# Altium schematic symbol library SCHLIB.SchLib: 2608 symbols (part 5 of 20) (continued)
## IC-CSD95480RWJT
designator U?, comment CSD95480
70A Synchronous Buck NexFET™ Smart Power Stage 41-PQFN; Manufacturer: Texas Instruments; Manufacturer Part Number: CSD95480RWJT; Interface: PWM; Max Output Current: 90A; Input Voltage (Max): 16; Input Voltage (Min): 4.5; Output Current (Max): 70; Supplier 1: Mouser; Supplier Part Number 1: 595-CSD95480RWJT; RoHS: Yes; Category: Smart Power Stage; Pricing 1: 1=6.86000, 10=6.16000, 25=5.82000, 50=5.82000, 100=5.05000, 250=4.78000, 1000=4.78000, 10000=4.78000 (USD); Mount: Surface Mount; Case/Package: VQFN-41; Number of Pins: 41; Min Operating Temperature: -55°C; Max Operating Temperature: 150°C; Packaging: Tape and Reel; Output Current per Channel: 70A; RoHS Compliant: Yes; ComponentLink1URL: http://www.ti.com/lit/ds/symlink/csd95480rwj.pdf?src-supplier=Digi-Key; ComponentLink1Description: http://www.ti.com/lit/ds/symlink/csd95480rwj.pdf?src-supplier=Digi-Key
footprint PowerTFQFN-41
pins: 1 VOS (in) "Output voltage sensing pin for the internal current sensing circuitry.", 2 AGND (power) "This pin is internally connected to PGND.", 3 VDD (power) "Supply Voltage for internal circuitry.", 4 PVDD (power) "Supply Voltage for Gate Drivers.", 5 PGND (power) "Power Ground.", 6 NC "Not Connected. This pin needs to be left floating in application.", 7 PGND (power) "Power Ground", 8 PGND (power) "Power Ground", 9 PGND (power) "Power Ground", 10 VSW (power) "Phase node connecting the HS MOSFET Source and LS MOSFET Drain – pin connection to the output inductor.", 11 VSW (power) "Phase node connecting the HS MOSFET Source and LS MOSFET Drain – pin connection to the output inductor.", 12 VSW (power) "Phase node connecting the HS MOSFET Source and LS MOSFET Drain – pin connection to the output inductor.", 13 VSW (power) "Phase node connecting the HS MOSFET Source and LS MOSFET Drain – pin connection to the output inductor.", 14 VSW (power) "Phase node connecting the HS MOSFET Source and LS MOSFET Drain – pin connection to the output inductor.", 15 VSW (power) "Phase node connecting the HS MOSFET Source and LS MOSFET Drain – pin connection to the output inductor.", 16 VSW (power) "Phase node connecting the HS MOSFET Source and LS MOSFET Drain – pin connection to the output inductor.", 17 VSW (power) "Phase node connecting the HS MOSFET Source and LS MOSFET Drain – pin connection to the output inductor.", 18 VSW (power) "Phase node connecting the HS MOSFET Source and LS MOSFET Drain – pin connection to the output inductor.", 19 VSW (power) "Phase node connecting the HS MOSFET Source and LS MOSFET Drain – pin connection to the output inductor.", 20 PGND (power) "Power Ground", 21 PGND (power) "Power Ground", 22 PGND (power) "Power Ground", 23 PGND (power) "Power Ground", 24 PGND (power) "Power Ground", 25 VIN (power) "Input Voltage Pin. Connect input capacitors close to this pin", 26 VIN (power) "Input Voltage Pin. Connect input capacitors close to this pin", 27 VIN (power) "Input Voltage Pin. Connect input capacitors close to this pin", 28 VIN (power) "Input Voltage Pin. Connect input capacitors close to this pin", 29 VIN (power) "Input Voltage Pin. Connect input capacitors close to this pin", 30 VIN (power) "Input Voltage Pin. Connect input capacitors close to this pin", 31 NC "Input Voltage Pin. Connect input capacitors close to this pin", 32 BOOTR "Return path for HS gate driver. It is connected to VSW internally.", 33 BOOT "Bootstrap capacitor connection. Connect a minimum 0.1uF 16V X5R, ceramic cap from BOOT to BOOT_R pins. The bootstrap capacitor provides the charge to turn on the Control FET. The bootstrap diode is integrated", 34 PWM (in) "Three state input from external controller. Logic Low sets Control FET gate low and Sync FET gate high. Logic High sets Control FET gate high and Sync FET gate Low. Both MOSFET gates are set low if PWM stays in Hi-Z for greater than the Three State Shutd", 35 EN/FCCM (in) "This dual function pin either enables the Diode Emulation function or is used to quickly disable the LS for controller-side diode emulation. When this pin is held at 1.7V, Diode Emulation Mode is enabled for Sync FET. When the pin is High, device operate", 36 TAO/FAULT (out) "Temperature Amplifier Output. Reports a voltage proportional to the IC temperature. An oring diode is integrated in the IC. When used in multiphase application, a single wire can be used to connect the TAO pins of all the ICs. Only the highest temperatur", 37 LSET (in) "A Resistor from this pin to PGND pin sets the inductor value for the internal current sensing circuitry", 38 IOUT (in) "Output of Current Sensing Amplifier. V(IOUT) – V(REFIN) is proportional to the phase current", 39 REFIN (in) "External reference voltage input for Current Sensing Amplifier.", 40 PGND (power) "Power Ground.", 41 NC "Not Connected. This pin needs to be left floating in application"

## IC-CSR1010A05-IQQM-R
designator U?, comment CSR1010A05-IQQM-R  Package: QFN-32
IC RF TXRX+MCU BLUETOOTH 32UFQFN; Manufacturer: Qualcomm; Washability: OK; Supplier 1: Digi-Key; Manufacturer Part Number: CSR1010A05-IQQM-R; Stock 1: 14468; Pricing 1: 1=2.57, 10=2.323, 25=2.0736, 100=1.8664, 250=1.659, 500=1.45162, 1000=1.20278 (USD); Supplier Part Number 1: CSR1010A05-IQQM-RDKR-ND
footprint QFN-32
pins: 0 GND, 1 VDD_BAT, 2 XTAL_32K_OUT, 3 XTAL_32K_IN, 4 WAKE, 5 VDD_CORE, 6 VDD_REG_IN, 7 RF, 8 VDD_XTAL, 9 XTAL_16M_OUT, 10 XTAL_16M_IN, 11 AIO[2], 12 AIO[1], 13 AIO[0], 14 PIO[1] /UART_TX, 15 PIO[1] /UART_RX, 16 PIO[3] /SF_DIN, 17 PIO[4] /SF_CS#, 18 PIO[5] /DEBUG_CLK, 19 PIO[6] /DEBUG_CS#, 20 PIO[7] /DEBUG_MOSI, 21 VDD_PADS, 22 PIO[8] /DEBUG_MISO, 23 PIO[9], 24 PIO[10], 25 PIO[11], 26 SPI_PIO#, 27 PIO[2], 28 I2C_SCL, 29 I2C_SDA, 30 VDD_CORE, 31 SMPS_LX, 32 VDD_BAT_SMPS

## IC-DAC5311IDCKR
designator U?, comment DAC5311
IC DAC 8BIT 1CH LP SC70-6; Manufacturer: Texas Instruments; Manufacturer Part Number: DAC5311IDCKR; Number of Channels: 1; Max Supply Voltage: 5.5V; Min Supply Voltage: 2V; Max Power Dissipation: 880uW; Interface: SPI; Settling Time: 6us; Number of Bits: 8; Resolution: 8b; Sampling Rate: 225KS/s; Supply Type: Single; Integral Nonlinearity (INL): 0.25LSB; Spurious-free dynamic range (SFDR): 65dB; Signal to Noise Ratio (SNR): 81dB; Nominal Supply Current: 110uA; Polarity: Unipolar; Output Type: Voltage; Washability: OK; Supplier 1: Digi-Key; Supplier Part Number 1: 296-24180-6-ND; Stock 1: 19970; Pricing 1: 1=1.5, 10=1.337, 100=1.0424, 500=0.86108, 1000=0.6798 (USD); Case/Package: SC; Number of Pins: 6; Contact Plating: Gold; Min Operating Temperature: -40°C; Max Operating Temperature: 125°C; Packaging: Tape and Reel; Package Quantity: 3000; Number of DAC Channels: 1; Number of Converters: 1; Conversion Rate: 225KS/s; Differential Nonlinearity: 0.25LSB; Radiation Hardening: No; REACH SVHC: No SVHC; Lead Free: Lead Free; ComponentLink1URL: http://www.farnell.com/datasheets/1725053.pdf?src-supplier=Element14; ComponentLink1Description: http://www.farnell.com/datasheets/1725053.pdf?src-supplier=Element14; ComponentLink2URL: http://www.ti.com/lit/ds/symlink/dac5311.pdf?src-supplier=Digi-Key; ComponentLink2Description: http://www.ti.com/lit/ds/symlink/dac5311.pdf?src-supplier=Digi-Key; ComponentLink3URL: http://www.produktinfo.conrad.com/datenblaetter/1100000-1199999/001186518-da-01-en-IC_DAC_8BIT_1CH_DAC5311IDCKR_SC_70_6_TID.pdf?src-supplier=Conrad; ComponentLink3Description: http://www.produktinfo.conrad.com/datenblaetter/1100000-1199999/001186518-da-01-en-IC_DAC_8BIT_1CH_DAC5311IDCKR_SC_70_6_TID.pdf?src-supplier=Conrad
footprint SOT-363
pins: 1 ~{SYNC}, 2 SCLK, 3 DIN, 4 AVDD, 5 GND, 6 VOUT

## IC-DMG6968UDM-7
designator U?, comment DMG6968
MOSFET 2N-CH 20V 6.5A SOT-26; Manufacturer: Diodes; Manufacturer Part Number: DMG6968UDM-7; Number of Channels: 2; Element Configuration: Dual; Gate to Source Voltage (Vgs): 8V; On-State Resistance: 24mR; Power Dissipation: 850mW; Turn-Off Delay Time: 562ns; Turn-On Delay Time: 53ns; Fall Time: 234ns; Input Capacitance: 143pF; Rise Time: 78ns; FET Type: 2 N-Channel; Washability: OK; RoHS: Yes; Category: MOSFETs; Mount: Surface Mount; Case/Package: SOT-26; Number of Pins: a; Min Operating Temperature: -55°C; Max Operating Temperature: 150°C; Drain to Source Voltage (Vdss): 20V; Continuous Drain Current (ID): 6.5A; Drain to Source Breakdown Voltage: 20V; Drain to Source Resistance: 24mR; Package Quantity: 3000; Packaging: Tape and Reel; Rds On Max: 24mR; Max Power Dissipation: 850mW; Number of Elements: 2; Length: 3mm; Height: 1.1mm; Width: 1.6mm; Radiation Hardening: No; REACH SVHC: No SVHC; Lead Free: Lead Free; ComponentLink1URL: https://datasheet.ciiva.com/929/ds31758-929568.pdf?src-supplier=Digi-Key; ComponentLink1Description: https://datasheet.ciiva.com/929/ds31758-929568.pdf?src-supplier=Digi-Key; ComponentLink2URL: https://datasheet.ciiva.com/11174/ds31758-11174898.pdf?src-supplier=Avnet; ComponentLink2Description: https://datasheet.ciiva.com/11174/ds31758-11174898.pdf?src-supplier=Avnet; ComponentLink3URL: https://datasheet.ciiva.com/4443/ds31758-90272-4443012.pdf?src-supplier=Mouser; ComponentLink3Description: https://datasheet.ciiva.com/4443/ds31758-90272-4443012.pdf?src-supplier=Mouser; ComponentLink4URL: https://datasheet.ciiva.com/929/ds31758-929569.pdf?src-supplier=Digi-Key; ComponentLink4Description: https://datasheet.ciiva.com/929/ds31758-929569.pdf?src-supplier=Digi-Key; Supplier 1: Digi-Key; Supplier Part Number 1: DMG6968UDMDICT-ND; Stock: 55957; Pricing: 1=0.44, 10=0.379, 25=0.3536, 100=0.2626, 250=0.2495, 500=0.205, 1000=0.1667 (USD)
footprint SOT23-6
pins: 1 S1, 2 D1/D2, 3 S2 , 4 G2, 5 D1/D2, 6 G1

## IC-DS90UB953TRHBRQ1
designator U?, comment DS90UB953TRHBRQ1
2MP MIPI CSI-2 FPD-Link III Serializer; Manufacturer: Texas Instruments; Data Rate: 4.16Gbps; Number of Inputs: 1; Supplier 1: Digi-Key; Manufacturer Part Number: DS90UB953TRHBRQ1; RoHS: Yes; Category: Interface ICs; Pricing 1: 1=11.13000, 10=10.22900, 25=9.80480, 100=8.75000 (USD); Mount: Surface Mount; Case/Package: VQFN; Min Operating Temperature: -40°C; Max Operating Temperature: 105°C; Packaging: Tape and Reel; Number of Outputs: 1; RoHS Compliant: Yes; ComponentLink1URL: http://www.ti.com/lit/ds/symlink/ds90ub953-q1.pdf?src-supplier=Digi-Key; ComponentLink1Description: http://www.ti.com/lit/ds/symlink/ds90ub953-q1.pdf?src-supplier=Digi-Key; Supplier Part Number 1: 296-49634-1-ND
part A pins: 1 CSI_D1P (in), 2 CSI_D1N (in), 3 CSI_D0P (in), 4 CSI_D0N (in), 5 CSI_CLKP (in), 6 CSI_CLKN (in), 7 RES0 (in), 8 PDB (in), 9 LPF1, 12 LPF2, 13 DOUT- (io), 14 DOUT+ (io), 17 GPIO_0 (io), 18 GPIO_1 (io), 19 CLK_OUT/IDX (io), 20 CLKIN (in), 21 MODE (in), 22 RES1, 23 I2C_SDA (io), 24 I2C_SCL (io), 27 GPIO_2 (io), 28 GPIO_3 (io), 29 CSI_D3P (in), 30 CSI_D3N (in), 31 CSI_D2P (in), 32 CSI_D2N (in), 33 GND (power)
part B pins: 10 VDDPLL_CAP (power), 11 VDDPLL (power), 15 VDDDRV_CAP (power), 16 VDDDRV (power), 25 VDDD (power), 26 VDDD_CAP (power)

## IC-DS1683S+T&R
designator U?, comment DS1683S
IC REAL TIME EVENT REC 8SOIC; Manufacturer: Maxim; Manufacturer Part Number: DS1683S+T&R; Interface: I2C,Serial,2-Wire; Time Format: Binary; Memory Size: 16B; Logic Function: Clock; Supplier 1: Digi-Key; Supplier Part Number 1: DS1683S+T&RCT-ND; Stock: 3510; Pricing: 1=4.38, 10=3.932, 25=3.7172, 100=3.2217, 250=3.0565, 500=2.7426, 1000=2.313 (USD); RoHS: Yes; Mount: Surface Mount; Case/Package: SOIC; Number of Pins: 8; Min Operating Temperature: -40°C; Max Operating Temperature: 85°C; Package Quantity: 2500; Packaging: Tape and Reel; Date Format: Binary; ComponentLink1URL: https://datasheet.ciiva.com/14244/ds1683-14244282.pdf?src-supplier=Avnet; ComponentLink1Description: https://datasheet.ciiva.com/14244/ds1683-14244282.pdf?src-supplier=Avnet
footprint SOIC8
pins: 1 EVENT, 2 NC, 3 ALARM, 4 GND, 5 SCL, 6 SDA, 7 NC, 8 VCC

## IC-EL3H7(B)(TA)-VG
designator U?, comment EL3H7(B)(TA)-VG
OPTOISOLATOR 3.75KV TRANS 4-SSOP; Manufacturer: Everlight; Max Output Voltage: 80V; Output Current per Channel: 50mA; Collector Emitter Saturation Voltage: 200mV; Fall Time: 18000ns; Number of Elements: 1; Power Dissipation: 200mW; Current Transfer Ratio: 260%; Forward Voltage: 1.4V; Reverse Breakdown Voltage: 6V; Approvals: UL; Supplier 1: Digi-Key; Supplier Part Number 1: 1080-1197-1-ND; Manufacturer Part Number: EL3H7(B)(TA)-VG; Stock: 190343; Pricing: 1=0.47, 10=0.333, 100=0.1957, 500=0.1354, 1000=0.1128, 2000=0.1015 (USD); RoHS: Yes; Mount: Surface Mount; Case/Package: SSOP; Number of Pins: 4; Min Operating Temperature: -55°C; Max Operating Temperature: 125°C; Max Input Current: 50mA; Max Collector Current: 50mA; Isolation Voltage: 3.75kV; Collector Emitter Breakdown Voltage: 80V; Packaging: Tape and Reel; Package Quantity: 1; Number of Channels: 1; Collector Emitter Voltage (VCEO): 80V; Max Power Dissipation: 200mW; Forward Current: 50mA; Rise Time: 18000ns; Radiation Hardening: No; Lead Free: Lead Free; ComponentLink1URL: https://datasheet.ciiva.com/2086/el3h7-g-series-2086501.pdf?src-supplier=Digi-Key; ComponentLink1Description: https://datasheet.ciiva.com/2086/el3h7-g-series-2086501.pdf?src-supplier=Digi-Key; ComponentLink2URL: https://datasheet.ciiva.com/2086/el3h7-g-series-2086502.pdf?src-supplier=Digi-Key; ComponentLink2Description: https://datasheet.ciiva.com/2086/el3h7-g-series-2086502.pdf?src-supplier=Digi-Key; ComponentLink3URL: https://datasheet.ciiva.com/2086/el3h7-g-series-2086503.pdf?src-supplier=Digi-Key; ComponentLink3Description: https://datasheet.ciiva.com/2086/el3h7-g-series-2086503.pdf?src-supplier=Digi-Key; ComponentLink4URL: https://datasheet.ciiva.com/15209/getdatasheetpartid-416716-15209115.pdf?src-supplier=Verical; ComponentLink4Description: https://datasheet.ciiva.com/15209/getdatasheetpartid-416716-15209115.pdf?src-supplier=Verical
footprint SOIC4
pins: 1, 2, 3, 4

## IC-HEF4011BT,653
designator U?, comment HEF4011BT  Case/Package: SOIC14
IC GATE NAND 4CH 2-INP SOIC14; Manufacturer: NXP Semiconductors; Manufacturer Part Number: HEF4011BT,653; Output Current: 2.4mA; Max Supply Voltage: 15V; Min Supply Voltage: 3V; Quiescent Current: 1uA; Propagation Delay: 110ns; Number of Outputs: 1; Number of Inputs: 2; Number of Circuits: 4; High Level Output Current: -4.2mA; Low Level Output Current: 4.2mA; Turn-On Delay Time: 20ns; Washability: OK; Supplier 1: Digi-Key; Stock 1: 0; Mount: Surface Mount; Number of Pins: 14; Contact Plating: Gold; Min Operating Temperature: -40°C; Max Operating Temperature: 125°C; Packaging: Tape and Reel; Logic Function: NAND; Package Quantity: 1; Number of Gates: 4; Number of Input Lines: 2; Number of Output Lines: 1; Number of Elements: 4; Voltage: 15V; Radiation Hardening: No; REACH SVHC: No SVHC; Lead Free: Lead Free; ComponentLink1URL: http://www.nxp.com/documents/data_sheet/HEF4011B.pdf; ComponentLink1Description: http://www.nxp.com/documents/data_sheet/HEF4011B.pdf; ComponentLink2URL: https://www.verical.com/server-webapp/html/getDatasheet?partID=246727; ComponentLink2Description: https://www.verical.com/server-webapp/html/getDatasheet?partID=246727; ComponentLink3URL: http://www.farnell.com/datasheets/2051437.pdf; ComponentLink3Description: http://www.farnell.com/datasheets/2051437.pdf; Supplier Part Number 1: 568-8223-1-ND
footprint SOIC14
pins: 1 1A, 2 1B, 3 1Y, 4 2Y, 5 2A, 6 2B, 7 GND, 8 3A, 9 3B, 10 3Y, 11 4Y, 12 4A, 13 4B, 14 VCC

## IC-HEF4051BT,653
designator U?, comment HEF4051BT
IC MUX/DEMUX 8X1 16SOIC; Manufacturer: Nexperia USA; Manufacturer Part Number: HEF4051BT,653; Washability: OK; Supplier 1: Digi-Key; Stock 1: 5426; Pricing 1: 1=0,45000, 10=0,38500, 25=0,35960, 100=0,28760, 250=0,26704, 500=0,22596, 1000=0,17461 (USD); RoHS: No; ComponentLink1URL: https://assets.nexperia.com/documents/data-sheet/HEF4051B.pdf?src-supplier=Digi-Key; ComponentLink1Description: https://assets.nexperia.com/documents/data-sheet/HEF4051B.pdf?src-supplier=Digi-Key; Supplier Part Number 1: 1727-2947-1-ND
footprint SOIC16
pins: 1 Y4, 2 Y6, 3 Z, 4 Y7, 5 Y5, 6 ~{E}, 7 VEE, 8 VSS, 9 S3, 10 S2, 11 S1, 12 Y3, 13 Y0, 14 Y1, 15 Y2, 16 VDD

## IC-HT0440LG-G
designator IC?, comment HT0440LG-G
IC GATE DRVR HIGH-SIDE 8SOIC; Manufacturer: Microchip Supertex; Output Voltage: 10V; Min Supply Voltage: -500mV; Max Supply Voltage: 7V; Rise Time: 650000ns; Frequency: 2MHz; Nominal Supply Current: 2mA; Number of Outputs: 2; Fall Time: 3000000ns; Turn-On Delay Time: 50us; Turn-Off Delay Time: 150us; Supplier 1: Avnet; Manufacturer Part Number: HT0440LG-G; Stock 1: 3300; Pricing 1: 3300=1.45140, 6600=1.43960, 13200=1.42780, 19800=1.41600, 26400=1.40420 (USD); RoHS: Yes; Mount: Surface Mount; Case/Package: SOIC; Number of Pins: 8; Min Operating Temperature: -40°C; Max Operating Temperature: 85°C; Packaging: Tape and Reel; Package Quantity: 2500; Number of Drivers: 2; ComponentLink1URL: https://datasheet.ciiva.com/15747/ht0440-15747219.pdf?src-supplier=Onlinecomponents.com; ComponentLink1Description: https://datasheet.ciiva.com/15747/ht0440-15747219.pdf?src-supplier=Onlinecomponents.com; ComponentLink2URL: https://datasheet.ciiva.com/30089/729ht0440-30089404.pdf?src-supplier=Onlinecomponents.com; ComponentLink2Description: https://datasheet.ciiva.com/30089/729ht0440-30089404.pdf?src-supplier=Onlinecomponents.com; Supplier Part Number 1: HT0440LG-G
footprint SOIC8-D0008A_M (SOIC, 8-Leads, Body 5x4mm, Pitch 1.27mm, IPC Low Density)
pins: 1 A, 2 CLK, 3 -VOUTA, 4 +VOUTA, 5 +VOUTB, 6 -VOUTB, 7 GND, 8 B

## IC-INA240A3PWR
designator U?, comment INA240A3PWR
IC AMP CURRENT SENSE 8-TSSOP; Manufacturer: Texas Instruments; Number of Circuits: 1; Slew Rate: 2V/µs; -3db Bandwidth: 400kHz; Input Bias Current: 90uA; Input Offset Voltage (Vos): 5uV; Operating Supply Current: 1.8mA; Number of Poles: 2; Fail Short: No; Approvals: UL; Supplier 1: Digi-Key; Supplier Part Number 1: 296-45090-1-ND; Manufacturer Part Number: INA240A3PWR; Stock: 8804; Pricing: 1=2.78, 10=2.499, 25=2.3624, 100=1.9425, 250=1.743, 500=1.68, 1000=1.3965 (USD); RoHS: No; Mount: Surface Mount; Case/Package: TSSOP; Number of Pins: 8; Min Operating Temperature: -40°C; Max Operating Temperature: 125°C; Packaging: Tape and Reel; ComponentLink1URL: http://www.ti.com/general/docs/lit/getliterature.tsp?genericPartNumber=INA240&fileType=pdf&src-supplier=Farnell; ComponentLink1Description: http://www.ti.com/general/docs/lit/getliterature.tsp?genericPartNumber=INA240&fileType=pdf&src-supplier=Farnell; ComponentLink2URL: http://www.ti.com/lit/ds/symlink/ina240.pdf?src-supplier=Digi-Key; ComponentLink2Description: http://www.ti.com/lit/ds/symlink/ina240.pdf?src-supplier=Digi-Key; Weight: 12.345887oz; Contact Plating: Tin; Number of Terminals: 2; Termination: SMD/SMT; Package Quantity: 1500; Length: 5mm; Depth: 5mm; REACH SVHC: No SVHC; ComponentLink3URL: https://datasheet.ciiva.com/4498/2031-xxt-72636-4498914.pdf?src-supplier=Mouser; ComponentLink3Description: https://datasheet.ciiva.com/4498/2031-xxt-72636-4498914.pdf?src-supplier=Mouser; ComponentLink4URL: https://datasheet.ciiva.com/30051/2902031-xxt-30051287.pdf?src-supplier=Onlinecomponents.com; ComponentLink4Description: https://datasheet.ciiva.com/30051/2902031-xxt-30051287.pdf?src-supplier=Onlinecomponents.com; ComponentLink5URL: https://datasheet.ciiva.com/323/2031-xxt-323225.pdf?src-supplier=Digi-Key; ComponentLink5Description: https://datasheet.ciiva.com/323/2031-xxt-323225.pdf?src-supplier=Digi-Key; ComponentLink6URL: https://datasheet.ciiva.com/323/2031-xxt-323226.pdf?src-supplier=Digi-Key; ComponentLink6Description: https://datasheet.ciiva.com/323/2031-xxt-323226.pdf?src-supplier=Digi-Key; ComponentLink7URL: https://datasheet.ciiva.com/323/2031-xxt-323227.pdf?src-supplier=Digi-Key; ComponentLink7Description: https://datasheet.ciiva.com/323/2031-xxt-323227.pdf?src-supplier=Digi-Key
footprint 8-TSSOP
pins: 1 NC, 2 IN+ (hiz), 3 IN- (hiz), 4 GND (power), 5 VS (power), 6 REF2, 7 REF1, 8 OUT (out)
text: -; +

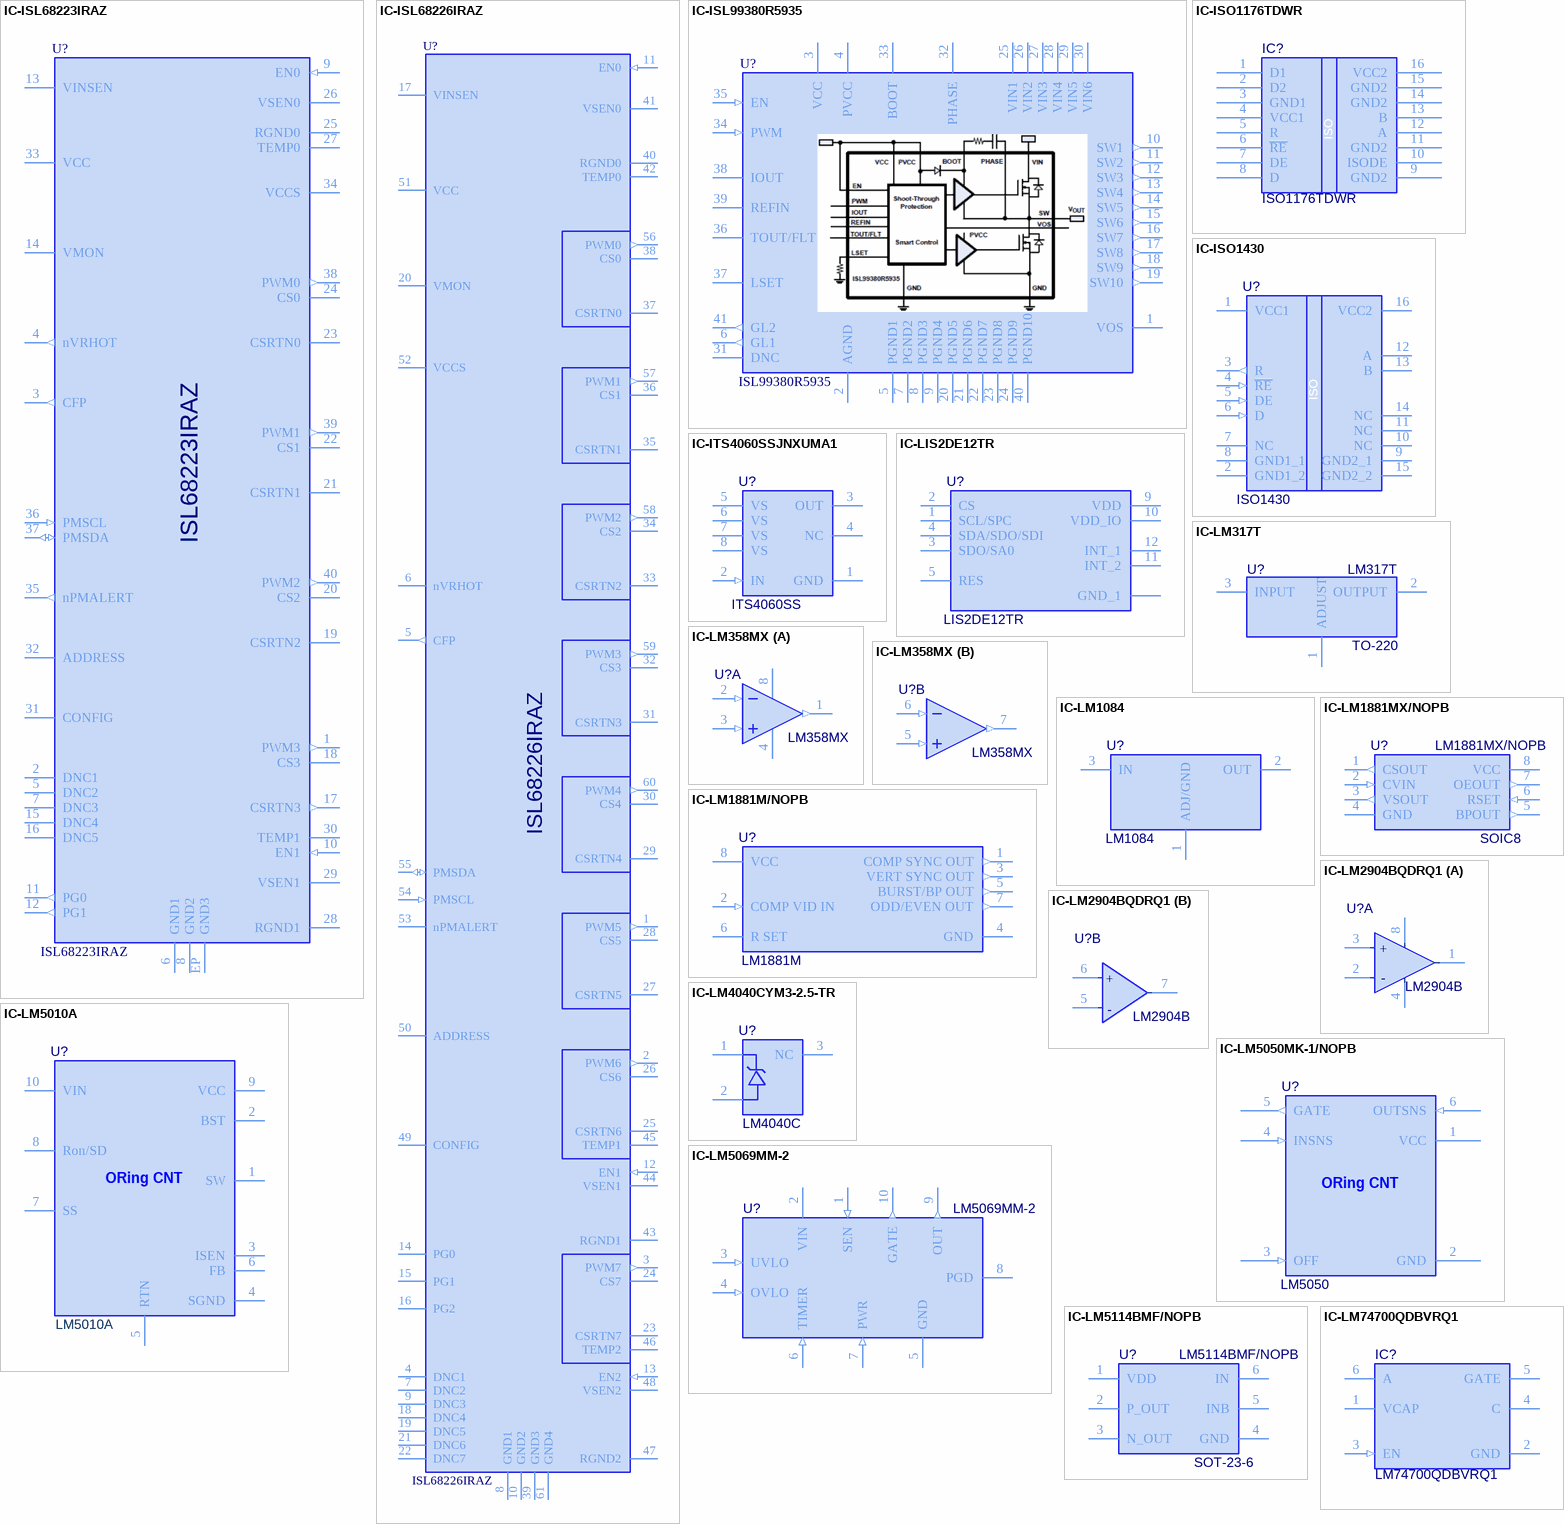
[diagram p19: symbols IC-ISL68223IRAZ to IC-LM74700QDBVRQ1]

## IC-ISL68223IRAZ
designator U?, comment ISL68223IRAZ
Digital Dual Output, 4-Phase PWM Controller; Manufacturer: Renesas; Manufacturer Part Number: ISL68223IRAZ-T; Outputs (Max): 2; Phases (Max): 4; Input Voltage (Min): 4.5; Input Voltage (Max): 18; Output Voltage (Max): 3.05; Output Current (Max): 360; Supplier 1: Mouser; RoHS: No; Category: Multiphase Switching Controller; Pricing 1: 1=6.51000, 10=5.88000, 50=5.61000, 100=4.87000, 1000=4.00000, 10000=4.00000 (USD); Supplier Part Number 1: 968-ISL68223IRAZ-T
pins: 1 PWM3 (out), 2 DNC1, 3 CFP (out), 4 nVRHOT (out), 5 DNC2, 6 GND1 (power), 7 DNC3, 8 GND2 (power), 9 EN0 (in), 10 EN1 (in), 11 PG0 (out), 12 PG1 (out), 13 VINSEN, 14 VMON, 15 DNC4, 16 DNC5, 17 CSRTN3 (out), 18 CS3, 19 CSRTN2 (hiz), 20 CS2, 21 CSRTN1, 22 CS1, 23 CSRTN0, 24 CS0, 25 RGND0, 26 VSEN0, 27 TEMP0, 28 RGND1, 29 VSEN1, 30 TEMP1, 31 CONFIG, 32 ADDRESS, 33 VCC (power), 34 VCCS (power), 35 nPMALERT (out), 36 PMSCL (in), 37 PMSDA (io), 38 PWM0 (out), 39 PWM1 (out), 40 PWM2 (out), EP GND3 (power)

## IC-ISL68226IRAZ
designator U?, comment ISL68226IRAZ
Digital Triple Output, 8-Phase PWM Controller; Manufacturer: Renesas; Outputs (Max): 3; Phases (Max): 8; Input Voltage (Min): 4.5; Input Voltage (Max): 18; Output Voltage (Max): 3.05; Output Current (Max): 720; Supplier 1: Mouser; Manufacturer Part Number: ISL68226IRAZ; RoHS: Yes; Category: Multiphase Switching Controller; Pricing 1: 1=9.03000, 10=8.16000, 50=7.78000, 100=6.75000, 1000=6.45000, 10000=6.45000 (USD); Supplier Part Number 1: 968-ISL68226IRAZ
pins: 1 PWM5 (out), 2 PWM6 (out), 3 PWM7 (out), 4 DNC1, 5 CFP (out), 6 nVRHOT (oc), 7 DNC2, 8 GND1 (power), 9 DNC3, 10 GND2 (power), 11 EN0 (in), 12 EN1 (in), 13 EN2 (in), 14 PG0 (oc), 15 PG1 (oc), 16 PG2 (oc), 17 VINSEN, 18 DNC4, 19 DNC5, 20 VMON, 21 DNC6, 22 DNC7, 23 CSRTN7, 24 CS7, 25 CSRTN6, 26 CS6, 27 CSRTN5, 28 CS5, 29 CSRTN4, 30 CS4, 31 CSRTN3, 32 CS3, 33 CSRTN2, 34 CS2, 35 CSRTN1, 36 CS1, 37 CSRTN0, 38 CS0, 39 GND3 (power), 40 RGND0, 41 VSEN0, 42 TEMP0, 43 RGND1, 44 VSEN1, 45 TEMP1, 46 TEMP2, 47 RGND2, 48 VSEN2, 49 CONFIG, 50 ADDRESS, 51 VCC (power), 52 VCCS (power), 53 nPMALERT, 54 PMSCL (in), 55 PMSDA (io), 56 PWM0 (out), 57 PWM1 (out), 58 PWM2 (out), 59 PWM3 (out), 60 PWM4 (out), 61 GND4 (power)

## IC-ISL99380R5935
designator U?, comment ISL99380R5935
80A Smart Power Stage (SPS) Module with Integrated High Accuracy Current and Temperature Monitors; Manufacturer: Renesas; Manufacturer Part Number: ISL99380FRZ-TR5935; Output Current (Max): 80; Input Voltage (Min): 3; Input Voltage (Max): 16; Switching Frequency (KHz): 1.25; Supplier 1: Mouser; Stock 1: 136; Pricing 1: 1=9.31000, 10=8.41000, 50=8.02000, 100=6.97000, 1000=5.80000, 10000=5.79000 (USD); ComponentLink1URL: https://datasheet.octopart.com/ISL99380FRZ-TR5935-Renesas-datasheet-149167368.pdf?src-supplier=Renesas; ComponentLink1Description: https://datasheet.octopart.com/ISL99380FRZ-TR5935-Renesas-datasheet-149167368.pdf?src-supplier=Renesas; Supplier Part Number 1: 968-SL99380FRZTR5935; Category: Smart Power Stage
pins: 1 VOS (power), 2 AGND (power), 3 VCC (power), 4 PVCC (power), 5 PGND1 (power), 6 GL1 (out), 7 PGND2 (power), 8 PGND3 (power), 9 PGND4 (power), 10 SW1 (out), 11 SW2 (out), 12 SW3 (out), 13 SW4 (out), 14 SW5 (out), 15 SW6 (out), 16 SW7 (out), 17 SW8 (out), 18 SW9 (out), 19 SW10 (out), 20 PGND5 (power), 21 PGND6 (power), 22 PGND7 (power), 23 PGND8 (power), 24 PGND9 (power), 25 VIN1 (power), 26 VIN2 (power), 27 VIN3 (power), 28 VIN4 (power), 29 VIN5 (power), 30 VIN6 (power), 31 DNC, 32 PHASE, 33 BOOT, 34 PWM (in), 35 EN (in), 36 TOUT/FLT (oc), 37 LSET, 38 IOUT, 39 REFIN, 40 PGND10 (power), 41 GL2 (out)

## IC-ISO1176TDWR
designator IC?, comment ISO1176TDWR
DG ISO 2.5KV RS422/RS485 16SOIC; Manufacturer: Texas Instruments; Min Supply Voltage: 3V; Max Supply Voltage: 5.5V; Number of Receivers: 1; Data Rate: 40Mbps; Logic Function: Transceiver; Simplex/Duplex: Half Duplex; Working Voltage: 566V; Supplier 1: Mouser; Manufacturer Part Number: ISO1176TDWR; Stock 1: 1426; Pricing 1: 1=6,19000, 10=5,59000, 25=5,34000, 100=4,42000, 250=4,03000, 500=3,77000 (USD); RoHS: Yes; Case/Package: SOIC; Number of Pins: 16; Min Operating Temperature: -40°C; Max Operating Temperature: 85°C; Packaging: Tape and Reel; Package Quantity: 2000; Number of Transmitters: 1; Number of Transceivers: 1; Radiation Hardening: No; Lead Free: Lead Free; ComponentLink1URL: https://datasheet.ciiva.com/14427/sllse28d-14427234.pdf?src-supplier=Avnet; ComponentLink1Description: https://datasheet.ciiva.com/14427/sllse28d-14427234.pdf?src-supplier=Avnet; ComponentLink2URL: https://datasheet.ciiva.com/26159/sllse28d-26159587.pdf?src-supplier=Avnet+Europe; ComponentLink2Description: https://datasheet.ciiva.com/26159/sllse28d-26159587.pdf?src-supplier=Avnet+Europe; ComponentLink3URL: https://datasheet.ciiva.com/1772/iso1176t-1772763.pdf?src-supplier=Digi-Key; ComponentLink3Description: https://datasheet.ciiva.com/1772/iso1176t-1772763.pdf?src-supplier=Digi-Key; Supplier Part Number 1: 595-ISO1176TDWR
footprint SOIC-16 7.3mm clearance (SOIC, 16-Leads, Body 10,30x7,50mm, Pitch 1,27mm, IPC Medium Density)
pins: 1 D1, 2 D2, 3 GND1, 4 VCC1, 5 R, 6 ~{RE}, 7 DE, 8 D, 9 GND2, 10 ISODE, 11 GND2, 12 A, 13 B, 14 GND2, 15 GND2, 16 VCC2
text: ISO

## IC-ISO1430
designator U?, comment ISO1430
ISO RS485/422 12MBPS HD 5KVRMS; Manufacturer: Texas Instruments; Manufacturer Part Number: ISO1430BDWR; Supplier 1: Digi-Key; Stock 1: 1502; Pricing 1: 1=5,67000, 10=5,09300, 25=4,81520, 100=3,95900, 250=3,55240, 500=3,42400, 1000=2,84620 (USD); RoHS: No; Supplier Part Number 1: 296-ISO1430BDWRCT-ND
footprint SOIC-16 (SOIC, 16-Leads, Body 10,30x7,50mm, Pitch 1,27mm, Thermal Pad 3,10x2,40mm, IPC Medium Density)
pins: 1 VCC1, 2 GND1_2, 3 R (out), 4 ~{RE} (in), 5 DE (in), 6 D (in), 7 NC, 8 GND1_1, 9 GND2_1, 10 NC, 11 NC, 12 A, 13 B, 14 NC, 15 GND2_2, 16 VCC2
text: ISO

## IC-ITS4060SSJNXUMA1
designator U?, comment ITS4060SS
IC SWITCH PWR HISIDE 8DSO; Manufacturer: Infineon; Manufacturer Part Number: ITS4060SSJNXUMA1; Number of Outputs: 1; On-State Resistance: 120mR; Turn-Off Delay Time: 230us; Turn-On Delay Time: 180us; Max Power Dissipation: 1.5W; Nominal Supply Current: 800uA; Max Supply Voltage: 34V; Supplier 1: Digi-Key; Supplier Part Number 1: ITS4060SSJNXUMA1CT-ND; Stock: 3258; Pricing: 1=1.49, 10=1.334, 25=1.2584, 100=1.0068, 250=0.881, 500=0.8558, 1000=0.6796 (USD); RoHS: Yes; Mount: Surface Mount; Case/Package: SOIC; Number of Pins: 8; Min Operating Temperature: -40°C; Max Operating Temperature: 125°C; Packaging: Tape and Reel; Package Quantity: 2500; Number of Channels: 1; Operating Supply Voltage: 34V; Lead Free: Lead Free; Halogen Free: Halogen Free; ComponentLink1URL: http://www.mouser.com/ds/2/196/Infineon-ITS4060S_SJ_N_01092012S-DS-v01_00-en-780445.pdf?src-supplier=Mouser; ComponentLink1Description: http://www.mouser.com/ds/2/196/Infineon-ITS4060S_SJ_N_01092012S-DS-v01_00-en-780445.pdf?src-supplier=Mouser; ComponentLink2URL: http://www.mouser.com/ds/2/196/Infineon-ITS4060S_SJ_N_01092012S-DS-v01_00-en-785694.pdf?src-supplier=Mouser; ComponentLink2Description: http://www.mouser.com/ds/2/196/Infineon-ITS4060S_SJ_N_01092012S-DS-v01_00-en-785694.pdf?src-supplier=Mouser; ComponentLink3URL: http://www.farnell.com/datasheets/2211691.pdf?src-supplier=Farnell; ComponentLink3Description: http://www.farnell.com/datasheets/2211691.pdf?src-supplier=Farnell; ComponentLink4URL: https://www.infineon.com/dgdl/Infineon-ITS4060S_SJ_N_01092012S-DS-v01_00-en.pdf?fileId=db3a304339dcf4b1013a0137d230573b&src-supplier=Digi-Key; ComponentLink4Description: https://www.infineon.com/dgdl/Infineon-ITS4060S_SJ_N_01092012S-DS-v01_00-en.pdf?fileId=db3a304339dcf4b1013a0137d230573b&src-supplier=Digi-Key; ComponentLink5URL: http://www.infineon.com/dgdl/Infineon-ITS4060S_SJ_N_01092012S-DS-v01_00-en.pdf?fileId=db3a304339dcf4b1013a0137d230573b&sd=t&src-supplier=Avnet; ComponentLink5Description: http://www.infineon.com/dgdl/Infineon-ITS4060S_SJ_N_01092012S-DS-v01_00-en.pdf?fileId=db3a304339dcf4b1013a0137d230573b&sd=t&src-supplier=Avnet
footprint SOIC8-D0008A_M (SOIC, 8-Leads, Body 5x4mm, Pitch 1.27mm, IPC Low Density)
pins: 1 GND (power) "Logic ground", 2 IN (in) "Input, controles the power switch; the powerswitch is ON when high", 3 OUT (power) "Output to the load", 4 NC "Not connected", 5 VS (power) "Supply voltage (design the wiring for the maximum short circuit current and also for low thermal resistance)", 6 VS (power) "Supply voltage (design the wiring for the maximum short circuit current and also for low thermal resistance)", 7 VS (power) "Supply voltage (design the wiring for the maximum short circuit current and also for low thermal resistance)", 8 VS (power) "Supply voltage (design the wiring for the maximum short circuit current and also for low thermal resistance)"

## IC-LIS2DE12TR
designator U?, comment LIS2DE12TR
ACCEL 2-16G I2C/SPI 12LGA; Manufacturer: STMicroelectronics; Bandwidth: 0.5Hz; Min Supply Voltage: 1.7V; Max Supply Voltage: 3.6V; Output Type: SPI,I2C,Digital; Axis: X, Y, Z; Washability: OK; Supplier 1: Digi-Key; Supplier Part Number 1: 497-15997-1-ND; Manufacturer Part Number: LIS2DE12TR; Stock 1: 13696; Pricing 1: 1=1.45000, 10=1.29800, 25=1.23200, 100=1.01200, 500=0.83600, 1000=0.66000 (USD); RoHS: Yes; Mount: Surface Mount; Case/Package: LGA; Number of Pins: 12; Contact Plating: Gold; Min Operating Temperature: -40°C; Max Operating Temperature: 85°C; Packaging: Cut Tape; REACH SVHC: No SVHC; Lead Free: Lead Free; ComponentLink1URL: http://www.farnell.com/datasheets/2028147.pdf?src-supplier=Farnell; ComponentLink1Description: http://www.farnell.com/datasheets/2028147.pdf?src-supplier=Farnell; ComponentLink2URL: https://www.mouser.com/ds/2/389/lis2de12-954977.pdf?src-supplier=Mouser; ComponentLink2Description: https://www.mouser.com/ds/2/389/lis2de12-954977.pdf?src-supplier=Mouser; ComponentLink3URL: http://www.st.com/content/ccc/resource/technical/document/datasheet/group0/72/cb/80/a7/5e/fe/46/9d/DM00153214/files/DM00153214.pdf/jcr:content/translations/en.DM00153214.pdf?src-supplier=Digi-Key; ComponentLink3Description: http://www.st.com/content/ccc/resource/technical/document/datasheet/group0/72/cb/80/a7/5e/fe/46/9d/DM00153214/files/DM00153214.pdf/jcr:content/translations/en.DM00153214.pdf?src-supplier=Digi-Key; ComponentLink4URL: http://www.st.com/st-web-ui/static/active/en/resource/technical/document/datasheet/DM00153214.pdf?src-supplier=Avnet; ComponentLink4Description: http://www.st.com/st-web-ui/static/active/en/resource/technical/document/datasheet/DM00153214.pdf?src-supplier=Avnet; ComponentLink5URL: http://www.farnell.com/datasheets/2028147.pdf?src-supplier=Element14; ComponentLink5Description: http://www.farnell.com/datasheets/2028147.pdf?src-supplier=Element14; ComponentLink6URL: http://www.st.com/st-web-ui/static/active/en/resource/technical/document/datasheet/DM00153214.pdf?src-supplier=Avnet+Asia; ComponentLink6Description: http://www.st.com/st-web-ui/static/active/en/resource/technical/document/datasheet/DM00153214.pdf?src-supplier=Avnet+Asia
footprint LGA-12 (LGA, 12-Leads, Body 2.00x2.00mmx1.00mm, Pitch 0.50mm)
pins: 1 SCL/SPC, 2 CS, 3 SDO/SA0, 4 SDA/SDO/SDI, 5 RES, 6 GND_1, 7 GND_2, 8 GND_3, 9 VDD, 10 VDD_IO, 11 INT_2, 12 INT_1

## IC-LM317T
designator U?, comment LM317T  Case/Package: TO-220
IC REG LIN POS ADJ 1.5A TO220AB; Manufacturer: STMicroelectronics; Number of Outputs: 1; Max Input Voltage: 40V; Min Input Voltage: 4.2V; Polarity: Positive; Output Type: Adjustable; Output Voltage: 37V; Min Output Voltage: 1.2V; Power Supply Rejection Ratio (PSRR): 80dB; Reference Voltage: 1.25V; Tolerance: 5%; Washability: OK; Supplier 1: Digi-Key; Manufacturer Part Number: LM317T; Stock 1: 33255; Pricing 1: 1=0.64, 50=0.5082, 100=0.4066, 500=0.31944, 1000=0.24684 (USD); Mount: Through Hole; Number of Pins: 3; Weight: 0.08113oz; Contact Plating: Matte,Tin; Min Operating Temperature: 0°C; Max Operating Temperature: 125°C; Output Current: 1.5A; Packaging: Rail/Tube; Max Output Current: 1.5A; Package Quantity: 50; Number of Regulators: 1; Max Output Voltage: 37V; Output Configuration: Positive; Length: 10.4mm; Height: 9.15mm; Width: 4.6mm; Radiation Hardening: No; Lead Free: Lead Free; REACH SVHC: No SVHC; ComponentLink1URL: http://www.farnell.com/datasheets/1815554.pdf; ComponentLink1Description: http://www.farnell.com/datasheets/1815554.pdf; ComponentLink2URL: http://www.rapidonline.com/pdf/47-3318.pdf; ComponentLink2Description: http://www.rapidonline.com/pdf/47-3318.pdf; ComponentLink3URL: https://www.distrelec.biz/Web/Downloads/a_/en/tnSTM-LM317_data_en.pdf?mime=application%2Fpdf; ComponentLink3Description: https://www.distrelec.biz/Web/Downloads/a_/en/tnSTM-LM317_data_en.pdf?mime=application%2Fpdf; ComponentLink4URL: http://www.mouser.com/ds/2/389/lm217-974117.pdf; ComponentLink4Description: http://www.mouser.com/ds/2/389/lm217-974117.pdf; ComponentLink5URL: http://www.st.com/content/ccc/resource/technical/document/datasheet/group1/a0/db/e6/9b/6f/9c/45/7b/CD00000455/files/CD00000455.pdf/jcr:content/translations/en.CD00000455.pdf; ComponentLink5Description: http://www.st.com/content/ccc/resource/technical/document/datasheet/group1/a0/db/e6/9b/6f/9c/45/7b/CD00000455/files/CD00000455.pdf/jcr:content/translations/en.CD00000455.pdf; ComponentLink6URL: https://produktinfo.conrad.com/datenblaetter/175000-199999/176001-da-01-en-IC_LM317T.pdf; ComponentLink6Description: https://produktinfo.conrad.com/datenblaetter/175000-199999/176001-da-01-en-IC_LM317T.pdf; Supplier Part Number 1: 497-1575-5-ND
footprint TO-220AB
pins: 1 ADJUST, 2 OUTPUT, 3 INPUT